# Altium footprint library LCLP.PcbLib: 75 footprints (part 2 of 5)
Each footprint in its own frame and in the unit in brackets; x right, y up, seen from the top. Pads: shape width x height; smd on the part's side, far side on the other; paste and mask are expansions set on the pad; w line width, h text height; cw(c..) or ccw(c..) is an arc to the next point about the centre after c.
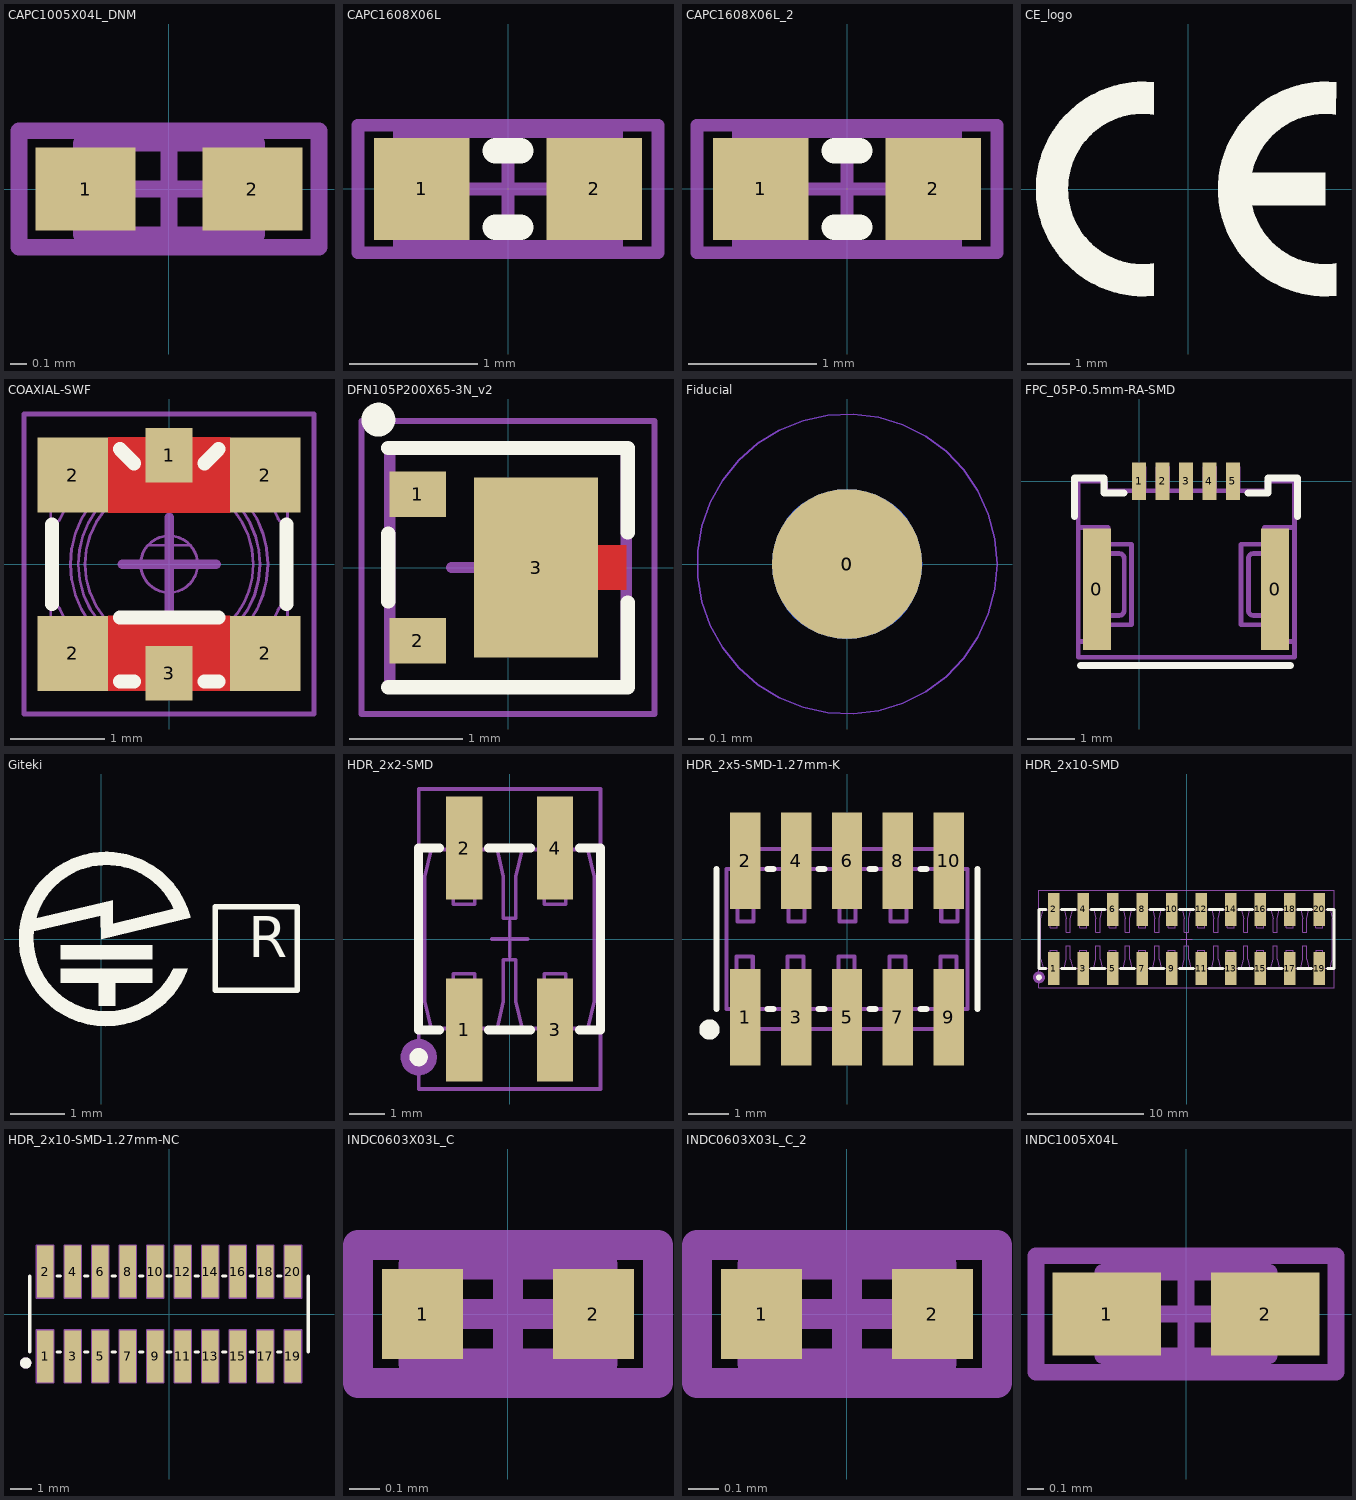
[diagram p1: the footprints below, top view; thin cyan lines are the x and y axes]

## CAPC1005X04L_DNM [mm] "Chip Capacitor, 2-Leads, Body 1.0x0.5mm, IPC High Density DNM"
height 0.4
pads (2):
  rect 0.6x0.5 smd: 1(-0.5,0) 2(0.5,0)
Mechanical 7:
  lines w0.1: -0.525,-0.275 -0.525,0.275 0.525,0.275 0.525,-0.275 -0.525,-0.275
  text ".Designator" at -1.524,-0.102 h0.3
Mechanical 15:
  lines w0.1: -0.275,0 0.275,0 ; 0,-0.275 0,0.275 ; -0.9,-0.35 0.9,-0.35 0.9,0.35 -0.9,0.35 -0.9,-0.35

## CAPC1608X06L [mm] "Chip Capacitor, 2-Leads, Body 1.6x0.8mm, IPC High Density"
height 0.55
pads (2):
  rect 0.75x0.8 smd: 1(-0.675,0) 2(0.675,0)
Top Overlay:
  lines w0.2: -0.1,-0.3 0.1,-0.3 ; -0.1,0.3 0.1,0.3
Mechanical 7:
  lines w0.1: -0.85,-0.45 0.85,-0.45 0.85,0.45 -0.85,0.45 -0.85,-0.45
  text ".Designator" at -1.524,-0.102 h0.3
Mechanical 15:
  lines w0.1: -0.45,0 0.45,0 ; 0,-0.45 0,0.45 ; -1.175,-0.5 -1.175,0.5 1.175,0.5 1.175,-0.5 -1.175,-0.5
3D body "C1608.step": height 0.8, standoff 0, extent -0.8,-0.4 0.8,0.4

## CAPC1608X06L_2 [mm]
pads (2):
  rect 0.75x0.8 smd: 1(-0.675,0) 2(0.675,0)
Top Overlay:
  lines w0.2: -0.1,-0.3 0.1,-0.3 ; -0.1,0.3 0.1,0.3
Mechanical 7:
  lines w0.1: -0.85,-0.45 -0.85,0.45 0.85,0.45 0.85,-0.45 -0.85,-0.45
  text ".Designator" at -1.525,-0.102 h0.31
Mechanical 15:
  lines w0.1: -0.45,0 0.45,0 ; 0,-0.45 0,0.45 ; -1.175,-0.5 1.175,-0.5 1.175,0.5 -1.175,0.5 -1.175,-0.5
3D body "C1608.step": height 0.8, standoff 0, extent -0.8,-0.4 0.8,0.4

## CE_logo [mm]
height 0.5
Top Overlay:
  drawing of 2 lines, arcs and shapes, not listed

## COAXIAL-SWF [mm]
pads (6):
  rect 0.5x0.58 smd: 1(0,1.16) 3(0,-1.16)
  rect 0.75x0.8 smd: 2(-1.025,-0.95) 2(-1.025,0.95) 2(1.025,-0.95) 2(1.025,0.95)
Top Layer:
  pour cut-out: -0.65,0.55 0.65,0.55 0.65,1.35 -0.65,1.35
  pour cut-out: 0.65,-0.55 -0.65,-0.55 -0.65,-1.35 0.65,-1.35
Top Overlay:
  lines w0.15: -1.25,-0.425 -1.25,0.425 ; -0.525,-1.25 -0.375,-1.25 ; -0.525,-0.57 0.525,-0.57 ; -0.525,1.225 -0.375,1.075 ; 0.375,-1.25 0.525,-1.25 ; 0.375,1.075 0.525,1.225 ; 1.25,-0.425 1.25,0.425
Mechanical 7:
  drawing of 206 lines, arcs and shapes, not listed
  text ".Designator" at -1.667,1.524 h0.31
Mechanical 15:
  lines w0.05: -1.547,-1.596 1.544,-1.596 1.544,1.6 -1.547,1.6 -1.547,-1.596
  lines w0.1: -0.5,0 0.5,0 ; 0,-0.5 0,0.5
3D body: height 1.4, standoff 0.6, extent -0.9,-0.9 0.9,0.901
3D body: height 0.75, standoff 0.6, extent -1.05,-1.049 1.05,1.05
3D body: height 0.95, standoff 0.75, extent -1,-0.999 1,1.001
3D body: height 0.6, standoff 0, extent 0.757,0.655 1.262,1.249
3D body: height 0.6, standoff 0, extent 0.757,-1.246 1.262,-0.653
3D body: height 0.6, standoff 0, extent -1.262,-1.25 -0.757,-0.649
3D body: height 0.6, standoff 0, extent -1.262,0.655 -0.757,1.248
3D body: height 0.55, standoff 0.1, extent -1.262,-1.252 1.262,1.253
3D body: height 0.9, standoff 0.6, extent -1.05,-1.049 1.05,1.05
3D body: height 1.25, standoff 0.95, extent -1.05,-1.049 1.05,1.05
3D body: height 1.55, standoff 1.25, extent -1.05,-1.05 1.05,1.05
3D body: height 0.15, standoff 0, extent -0.227,-1.301 0.227,-0.758
3D body: height 0.15, standoff 0, extent -0.227,0.899 0.227,1.299
3D body: height 0.6, standoff 0.55, extent -1.262,-1.248 1.262,1.251

## DFN105P200X65-3N_v2 [mm] "DFN, 3-Leads, Body 2.00x2.00mm, Pitch 1.05mm, IPC Medium Density"
height 0.65
pads (3):
  rect 0.5x0.4 smd: 1(-0.8,0.65) 2(-0.8,-0.65)
  rect 1.1x1.6 smd: 3(0.25,0)
Top Layer:
  rectangle: 0.65,-0.2 1.05,0.2
Top Overlay:
  circle w0.2: c-1.15,1.312 r0.05
  lines w0.125: -1.063,-1.063 1.062,-1.063 1.062,-0.312 ; -1.063,-0.3 -1.063,0.3 ; -1.063,1.062 1.062,1.062 1.062,0.312
Mechanical 7:
  lines w0.1: -1.05,-1.05 -1.05,1.05 1.05,1.05 1.05,-1.05 -1.05,-1.05
  text ".Designator" at -0.1,0.3 h0.38
Mechanical 15:
  lines w0.05: -1.3,-1.3 1.3,-1.3 1.3,1.3 -1.3,1.3 -1.3,-1.3
  lines w0.1: -0.5,0 0.5,0 ; 0,-0.5 0,0.5
3D body "SOT1061.step": height 0.65, standoff 0, extent -1.001,-1 1.001,1

## Fiducial [mm] "Fiducial Mark"
pads (2):
  round 1 smd paste+0 mask+0.5: 0(0,0)
  round 1 smd far side paste+0 mask+0.5: 0(0,0)
Top Layer keep-out:
  circle w0.01: c0,0 r1
Bottom Layer keep-out:
  circle w0.01: c0,0 r1

## FPC_05P-0.5mm-RA-SMD [mm] "FPC, 5-Leads, Pitch 0,5mm"
height 1.45
pads (7):
  rect 0.6x2.6 smd: 0(-0.9,-2.3) 0(2.9,-2.3)
  rect 0.3x0.8 smd mask+0.05: 1(0,0) 2(0.5,0) 3(1,0) 4(1.5,0) 5(2,0)
Top Overlay:
  lines w0.15: -1.375,-0.75 -1.375,0.075 -0.75,0.075 -0.75,-0.25 -0.325,-0.25 ; -1.25,-3.925 3.225,-3.925 ; 2.325,-0.25 2.75,-0.25 2.75,0.075 3.375,0.075 3.375,-0.75
Mechanical 7:
  lines w0.1: -1.3,-3.416 -0.661,-3.416 -0.661,-3.06 -0.162,-3.06 -0.162,-1.34 -0.661,-1.34 -0.661,-0.983 -1.3,-0.983 ; -1.033,-3.416 -1.033,-0.983 ; -1.027,-2.86 -0.422,-2.86 ccw(c-0.418,-2.762) -0.321,-2.761 -0.321,-1.642 ccw(c-0.418,-1.638) -0.422,-1.54 -1.027,-1.54 ; -0.098,-0.198 -0.098,0.305 0.106,0.305 0.106,-0.198 ; -0.098,-0.048 0.106,-0.048 ; -0.098,0.006 0.106,0.006 ; 0.401,-0.198 0.401,0.305 0.605,0.305 0.605,-0.198 ; 0.401,-0.048 0.605,-0.048 ; 0.401,0.006 0.605,0.006 ; 0.901,-0.198 0.901,0.305 1.104,0.305 1.104,-0.198 ; 0.901,-0.048 1.104,-0.048 ; 0.901,0.006 1.104,0.006 ; 1.406,-0.198 1.406,0.305 1.61,0.305 1.61,-0.198 ; 1.406,-0.048 1.61,-0.048 ; 1.406,0.006 1.61,0.006 ; 1.905,-0.198 1.905,0.305 2.109,0.305 2.109,-0.198 ; 1.905,-0.048 2.109,-0.048 ; 1.905,0.006 2.109,0.006 ; 3.039,-2.86 2.435,-2.86 cw(c2.431,-2.762) 2.333,-2.761 2.333,-1.642 cw(c2.431,-1.638) 2.435,-1.54 3.039,-1.54 ; 3.046,-3.416 3.046,-0.983 ; 3.313,-3.416 2.674,-3.416 2.674,-3.06 2.174,-3.06 2.174,-1.34 2.674,-1.34 2.674,-0.983 3.313,-0.983 ; -1.3,-3.75 -1.3,0.006 -0.712,0.006 -0.712,-0.198 2.724,-0.198 2.724,0.006 3.313,0.006 3.313,-3.75 -1.3,-3.75
  text ".Designator" at 2.524,-1.898 h0.31
3D body "512810594.stp": height 1.2, standoff 0, extent -1.3,-3.85 3.3,0.2

## Giteki [mm] "Japan certification mark"
height 0.5
Top Overlay:
  drawing of 9 lines, arcs and shapes, not listed
  text "R" at 2.7,-0.575 h1.3

## HDR_2x2-SMD [mil] "Board-Board Conn, Header, 4-way, 2-row"
height 393.7
pads (4):
  rect 40x113 smd: 1(-50,-100) 2(-50,100) 3(50,-100) 4(50,100)
Top Overlay:
  circle w10: c-100,-130 r5
  lines w10: -76.97,-100 -100,-100 -100,100 -76.97,100 ; -23.03,-100 23.03,-100 ; -23.03,100 23.03,100 ; 76.97,-100 100,-100 100,100 76.97,100
Mechanical 7:
  circle w20: c-100,-130 r10
  lines w3.94: -63.78,-98.43 -63.78,-119.75 ccw(c-50,-119.75) -36.22,-119.75 -36.22,-98.43 ; -63.78,98.43 -63.78,119.75 cw(c-50,119.75) -36.22,119.75 -36.22,98.43 ; 36.22,-98.43 36.22,-119.75 ccw(c50,-119.75) 63.78,-119.75 63.78,-98.43 ; 36.22,98.43 36.22,119.75 cw(c50,119.75) 63.78,119.75 63.78,98.43 ; -93.11,-68.71 -93.11,68.71 -86.22,98.43 -13.78,98.43 -6.89,68.71 -6.89,22.88 6.89,22.88 6.89,68.71 13.78,98.43 86.22,98.43 93.11,68.71 93.11,-68.71 86.22,-98.43 13.78,-98.43 6.89,-68.71 6.89,-22.88 -6.89,-22.88 -6.89,-68.71 -13.78,-98.43 -86.22,-98.43 -93.11,-68.71 ; -61.81,-61.81 -61.81,-38.19 -38.19,-38.19 -38.19,-61.81 -61.81,-61.81 ; -61.81,38.19 -61.81,61.81 -38.19,61.81 -38.19,38.19 -61.81,38.19 ; 38.19,-61.81 61.81,-61.81 61.81,-38.19 38.19,-38.19 38.19,-61.81 ; 38.19,38.19 61.81,38.19 61.81,61.81 38.19,61.81 38.19,38.19
  text ".Designator" at -60.02,-4 h12.01
Mechanical 15:
  lines w3.94: -19.68,0 19.69,0 ; 0,-19.68 0,19.68 ; -100,-165 100,-165 100,165 -100,165 -100,-165
3D body "pin_header_a-sl254-dg-g04mp1.stp": height 382.03, standoff -1.57, extent -100,-147.64 100,147.64

## HDR_2x5-SMD-1.27mm-K [mm] "SMT MICRO HEADER, (1,27) .050\" Keying Shroud"
height 4.68
pads (10):
  rect 0.76x2.4 smd: 1(-2.54,-1.95) 2(-2.54,1.95) 3(-1.27,-1.95) 4(-1.27,1.95) 5(0,-1.95) 6(0,1.95) 7(1.27,-1.95) 8(1.27,1.95) 9(2.54,-1.95) 10(2.54,1.95)
Top Overlay:
  circle w0.254: c-3.429,-2.258 r0.127
  lines w0.15: -3.25,-1.75 -3.25,1.75 ; -1.98,-1.75 -1.83,-1.75 ; -1.98,1.75 -1.83,1.75 ; -0.71,-1.75 -0.56,-1.75 ; -0.71,1.75 -0.56,1.75 ; 0.56,-1.75 0.71,-1.75 ; 0.56,1.75 0.71,1.75 ; 1.83,-1.75 1.98,-1.75 ; 1.83,1.75 1.98,1.75 ; 3.25,-1.75 3.25,1.75
Mechanical 7:
  lines w0.1: -2.74,-1.75 -2.74,-2.459 ccw(c-2.54,-2.459) -2.34,-2.459 -2.34,-2.25 ; -2.74,1.75 -2.74,2.459 cw(c-2.54,2.459) -2.34,2.459 -2.34,2.25 ; -2.5,-1.75 -2.5,-2.25 -1.25,-2.25 ; -2.5,1.75 -2.5,2.25 2.5,2.25 2.5,1.75 ; -1.47,-2.25 -1.47,-2.459 ccw(c-1.27,-2.459) -1.07,-2.459 -1.07,-2.25 ; -1.47,2.25 -1.47,2.459 cw(c-1.27,2.459) -1.07,2.459 -1.07,2.25 ; -1.25,-1.75 -1.25,-2.25 ; -0.2,-2.25 -0.2,-2.459 ccw(c0,-2.459) 0.2,-2.459 0.2,-2.25 ; -0.2,2.25 -0.2,2.459 cw(c0,2.459) 0.2,2.459 0.2,2.25 ; 1.07,-2.25 1.07,-2.459 ccw(c1.27,-2.459) 1.47,-2.459 1.47,-2.25 ; 1.07,2.25 1.07,2.459 cw(c1.27,2.459) 1.47,2.459 1.47,2.25 ; 1.25,-1.75 1.25,-2.25 ; 2.34,-2.25 2.34,-2.459 ccw(c2.54,-2.459) 2.74,-2.459 2.74,-1.75 ; 2.34,2.25 2.34,2.459 cw(c2.54,2.459) 2.74,2.459 2.74,1.75 ; 2.5,-1.75 2.5,-2.25 1.25,-2.25 ; -1.25,-2.25 1.25,-2.25 ; -3,-1.75 3,-1.75 3,1.75 -3,1.75 -3,-1.75 ; -2.75,-0.835 -2.35,-0.835 -2.35,-0.435 -2.75,-0.435 -2.75,-0.835 ; -2.73,0.435 -2.33,0.435 -2.33,0.835 -2.73,0.835 -2.73,0.435 ; -1.48,-0.835 -1.08,-0.835 -1.08,-0.435 -1.48,-0.435 -1.48,-0.835 ; -1.46,0.435 -1.06,0.435 -1.06,0.835 -1.46,0.835 -1.46,0.435 ; -0.21,-0.835 0.19,-0.835 0.19,-0.435 -0.21,-0.435 -0.21,-0.835 ; -0.19,0.435 0.21,0.435 0.21,0.835 -0.19,0.835 -0.19,0.435 ; 1.06,-0.835 1.46,-0.835 1.46,-0.435 1.06,-0.435 1.06,-0.835 ; 1.08,0.435 1.48,0.435 1.48,0.835 1.08,0.835 1.08,0.435 ; 2.33,-0.835 2.73,-0.835 2.73,-0.435 2.33,-0.435 2.33,-0.835 ; 2.35,0.435 2.75,0.435 2.75,0.835 2.35,0.835 2.35,0.435
  text ".Designator" at -1.525,-0.102 h0.31
3D body "Samtec-FTSH-105-01-F-DV-K.step": height 6.11, standoff -0.01, extent -3.137,-2.921 3.137,2.921

## HDR_2x10-SMD [mil] "Board-Board Conn, Header, 20-way, 2-row"
height 393.7
pads (20):
  rect 40x113 smd: 1(-450,-100) 2(-450,100) 3(-350,-100) 4(-350,100) 5(-250,-100) 6(-250,100) 7(-150,-100) 8(-150,100) 9(-50,-100) 10(-50,100) 11(50,-100) 12(50,100) 13(150,-100) 14(150,100) 15(250,-100) 16(250,100) 17(350,-100) 18(350,100) 19(450,-100) 20(450,100)
Top Overlay:
  circle w10: c-500,-130 r5
  lines w10: -476.97,-100 -500,-100 -500,100 -476.97,100 ; -423.03,-100 -376.97,-100 ; -423.03,100 -376.97,100 ; -323.03,-100 -276.97,-100 ; -323.03,100 -276.97,100 ; -223.03,-100 -176.97,-100 ; -223.03,100 -176.97,100 ; -123.03,-100 -76.97,-100 ; -123.03,100 -76.97,100 ; -23.03,-100 23.03,-100 ; -23.03,100 23.03,100 ; 76.97,-100 123.03,-100 ; 76.97,100 123.03,100 ; 176.97,-100 223.03,-100 ; 176.97,100 223.03,100 ; 276.97,-100 323.03,-100 ; 276.97,100 323.03,100 ; 376.97,-100 423.03,-100 ; 376.97,100 423.03,100 ; 476.97,-100 500,-100 500,100 476.97,100
Mechanical 7:
  drawing of 257 lines, arcs and shapes, not listed
  text ".Designator" at -60.02,-4 h12.01
Mechanical 15:
  lines w3.94: -19.68,0 19.69,0 ; 0,-19.68 0,19.68 ; -500,-165 500,-165 500,165 -500,165 -500,-165
3D body "pin_header_a-sl254-dg-g20mp1.stp": height 382.03, standoff -1.57, extent -499.99,-147.63 500.01,147.65

## HDR_2x10-SMD-1.27mm-NC [mm] "SMT MICRO HEADER, (1,27) .050\""
height 4.68
pads (20):
  rect 0.76x2.4 smd: 1(-5.715,-1.95) 2(-5.715,1.95) 3(-4.445,-1.95) 4(-4.445,1.95) 5(-3.175,-1.95) 6(-3.175,1.95) 7(-1.905,-1.95) 8(-1.905,1.95) 9(-0.635,-1.95) 10(-0.635,1.95) 11(0.635,-1.95) 12(0.635,1.95) 13(1.905,-1.95) 14(1.905,1.95) 15(3.175,-1.95) 16(3.175,1.95) 17(4.445,-1.95) 18(4.445,1.95) 19(5.715,-1.95) 20(5.715,1.95)
Top Overlay:
  circle w0.254: c-6.604,-2.258 r0.127
  lines w0.15: -6.425,-1.75 -6.425,1.75 ; -5.155,-1.75 -5.005,-1.75 ; -5.155,1.75 -5.005,1.75 ; -3.885,-1.75 -3.735,-1.75 ; -3.885,1.75 -3.735,1.75 ; -2.615,-1.75 -2.465,-1.75 ; -2.615,1.75 -2.465,1.75 ; -1.345,-1.75 -1.195,-1.75 ; -1.345,1.75 -1.195,1.75 ; -0.075,-1.75 0.075,-1.75 ; -0.075,1.75 0.075,1.75 ; 1.195,-1.75 1.345,-1.75 ; 1.195,1.75 1.345,1.75 ; 2.465,-1.75 2.615,-1.75 ; 2.465,1.75 2.615,1.75 ; 3.735,-1.75 3.885,-1.75 ; 3.735,1.75 3.885,1.75 ; 5.005,-1.75 5.155,-1.75 ; 5.005,1.75 5.155,1.75 ; 6.425,-1.75 6.425,1.75
Mechanical 7:
  circle w0.254: c-6.604,-2.258 r0.127
  lines w0.1: -6.425,-1.75 -6.425,1.75 ; -5.155,-1.75 -5.005,-1.75 ; -5.155,1.75 -5.005,1.75 ; -3.885,-1.75 -3.735,-1.75 ; -3.885,1.75 -3.735,1.75 ; -2.615,-1.75 -2.465,-1.75 ; -2.615,1.75 -2.465,1.75 ; -1.345,-1.75 -1.195,-1.75 ; -1.345,1.75 -1.195,1.75 ; -0.075,-1.75 0.075,-1.75 ; -0.075,1.75 0.075,1.75 ; 1.195,-1.75 1.345,-1.75 ; 1.195,1.75 1.345,1.75 ; 2.465,-1.75 2.615,-1.75 ; 2.465,1.75 2.615,1.75 ; 3.735,-1.75 3.885,-1.75 ; 3.735,1.75 3.885,1.75 ; 5.005,-1.75 5.155,-1.75 ; 5.005,1.75 5.155,1.75 ; 6.425,-1.75 6.425,1.75 ; -6.095,-3.15 -6.095,-0.75 -5.335,-0.75 -5.335,-3.15 -6.095,-3.15 ; -6.095,0.75 -6.095,3.15 -5.335,3.15 -5.335,0.75 -6.095,0.75 ; -4.825,-3.15 -4.825,-0.75 -4.065,-0.75 -4.065,-3.15 -4.825,-3.15 ; -4.825,0.75 -4.825,3.15 -4.065,3.15 -4.065,0.75 -4.825,0.75 ; -3.555,-3.15 -3.555,-0.75 -2.795,-0.75 -2.795,-3.15 -3.555,-3.15 ; -3.555,0.75 -2.795,0.75 -2.795,3.15 -3.555,3.15 -3.555,0.75 ; -2.285,-3.15 -2.285,-0.75 -1.525,-0.75 -1.525,-3.15 -2.285,-3.15 ; -2.285,0.75 -2.285,3.15 -1.525,3.15 -1.525,0.75 -2.285,0.75 ; -1.015,-3.15 -1.015,-0.75 -0.255,-0.75 -0.255,-3.15 -1.015,-3.15 ; -1.015,0.75 -1.015,3.15 -0.255,3.15 -0.255,0.75 -1.015,0.75 ; 0.255,-3.15 0.255,-0.75 1.015,-0.75 1.015,-3.15 0.255,-3.15 ; 0.255,0.75 0.255,3.15 1.015,3.15 1.015,0.75 0.255,0.75 ; 1.525,-3.15 1.525,-0.75 2.285,-0.75 2.285,-3.15 1.525,-3.15 ; 1.525,0.75 1.525,3.15 2.285,3.15 2.285,0.75 1.525,0.75 ; 2.795,-3.15 2.795,-0.75 3.555,-0.75 3.555,-3.15 2.795,-3.15 ; 2.795,0.75 2.795,3.15 3.555,3.15 3.555,0.75 2.795,0.75 ; 4.065,-3.15 4.065,-0.75 4.825,-0.75 4.825,-3.15 4.065,-3.15 ; 4.065,0.75 4.065,3.15 4.825,3.15 4.825,0.75 4.065,0.75 ; 5.335,-3.15 5.335,-0.75 6.095,-0.75 6.095,-3.15 5.335,-3.15 ; 5.335,0.75 5.335,3.15 6.095,3.15 6.095,0.75 5.335,0.75
  text ".Designator" at 2.247,-0.102 h0.31

## INDC0603X03L_C [mm] "Chip Inductor, 2-Leads, Body 0.6x0.3mm, IPC High Density"
height 0.33
pads (2):
  rect 0.27x0.3 smd: 1(-0.285,0) 2(0.285,0)
Mechanical 7:
  lines w0.1: -0.315,-0.165 0.315,-0.165 0.315,0.165 -0.315,0.165 -0.315,-0.165
  text ".Designator" at -1.507,-0.533 h0.31
Mechanical 15:
  lines w0.1: -0.165,0 0.165,0 ; 0,-0.165 0,0.165 ; -0.5,-0.23 0.5,-0.23 0.5,0.23 -0.5,0.23 -0.5,-0.23
3D body "INDC0603X03.step": height 0.3, standoff 0, extent -0.3,-0.15 0.3,0.15

## INDC0603X03L_C_2 [mm]
pads (2):
  rect 0.27x0.3 smd: 1(-0.285,0) 2(0.285,0)
Mechanical 7:
  lines w0.1: -0.315,-0.165 -0.315,0.165 0.315,0.165 0.315,-0.165 -0.315,-0.165
  text ".Designator" at -2.173,-0.102 h0.31
Mechanical 15:
  lines w0.1: -0.165,0 0.165,0 ; 0,-0.165 0,0.165 ; -0.5,-0.23 -0.5,0.23 0.5,0.23 0.5,-0.23 -0.5,-0.23
3D body "INDC0603X03.step": height 0.3, standoff 0, extent -0.3,-0.15 0.3,0.15

## INDC1005X04L [mm] "Chip Inductor, 2-Leads, Body 1.0x0.5mm, IPC High Density"
height 0.4
pads (2):
  rect 0.65x0.5 smd: 1(-0.475,0) 2(0.475,0)
Mechanical 7:
  lines w0.1: -0.5,-0.25 -0.5,0.25 0.5,0.25 0.5,-0.25 -0.5,-0.25
  text ".Designator" at -1.5,0.467 h0.31
Mechanical 15:
  lines w0.1: -0.275,0 0.275,0 ; 0,-0.275 0,0.275 ; -0.9,-0.35 -0.9,0.35 0.9,0.35 0.9,-0.35 -0.9,-0.35
3D body "INDC1005.step": height 0.5, standoff 0, extent -0.5,-0.25 0.5,0.25